# Altium footprint library 学习.PcbLib: 96 footprints (part 6 of 6)
Each footprint in its own frame and in the unit in brackets; x right, y up, seen from the top. Pads: shape width x height; smd on the part's side, far side on the other; paste and mask are expansions set on the pad; w line width, h text height; cw(c..) or ccw(c..) is an arc to the next point about the centre after c.
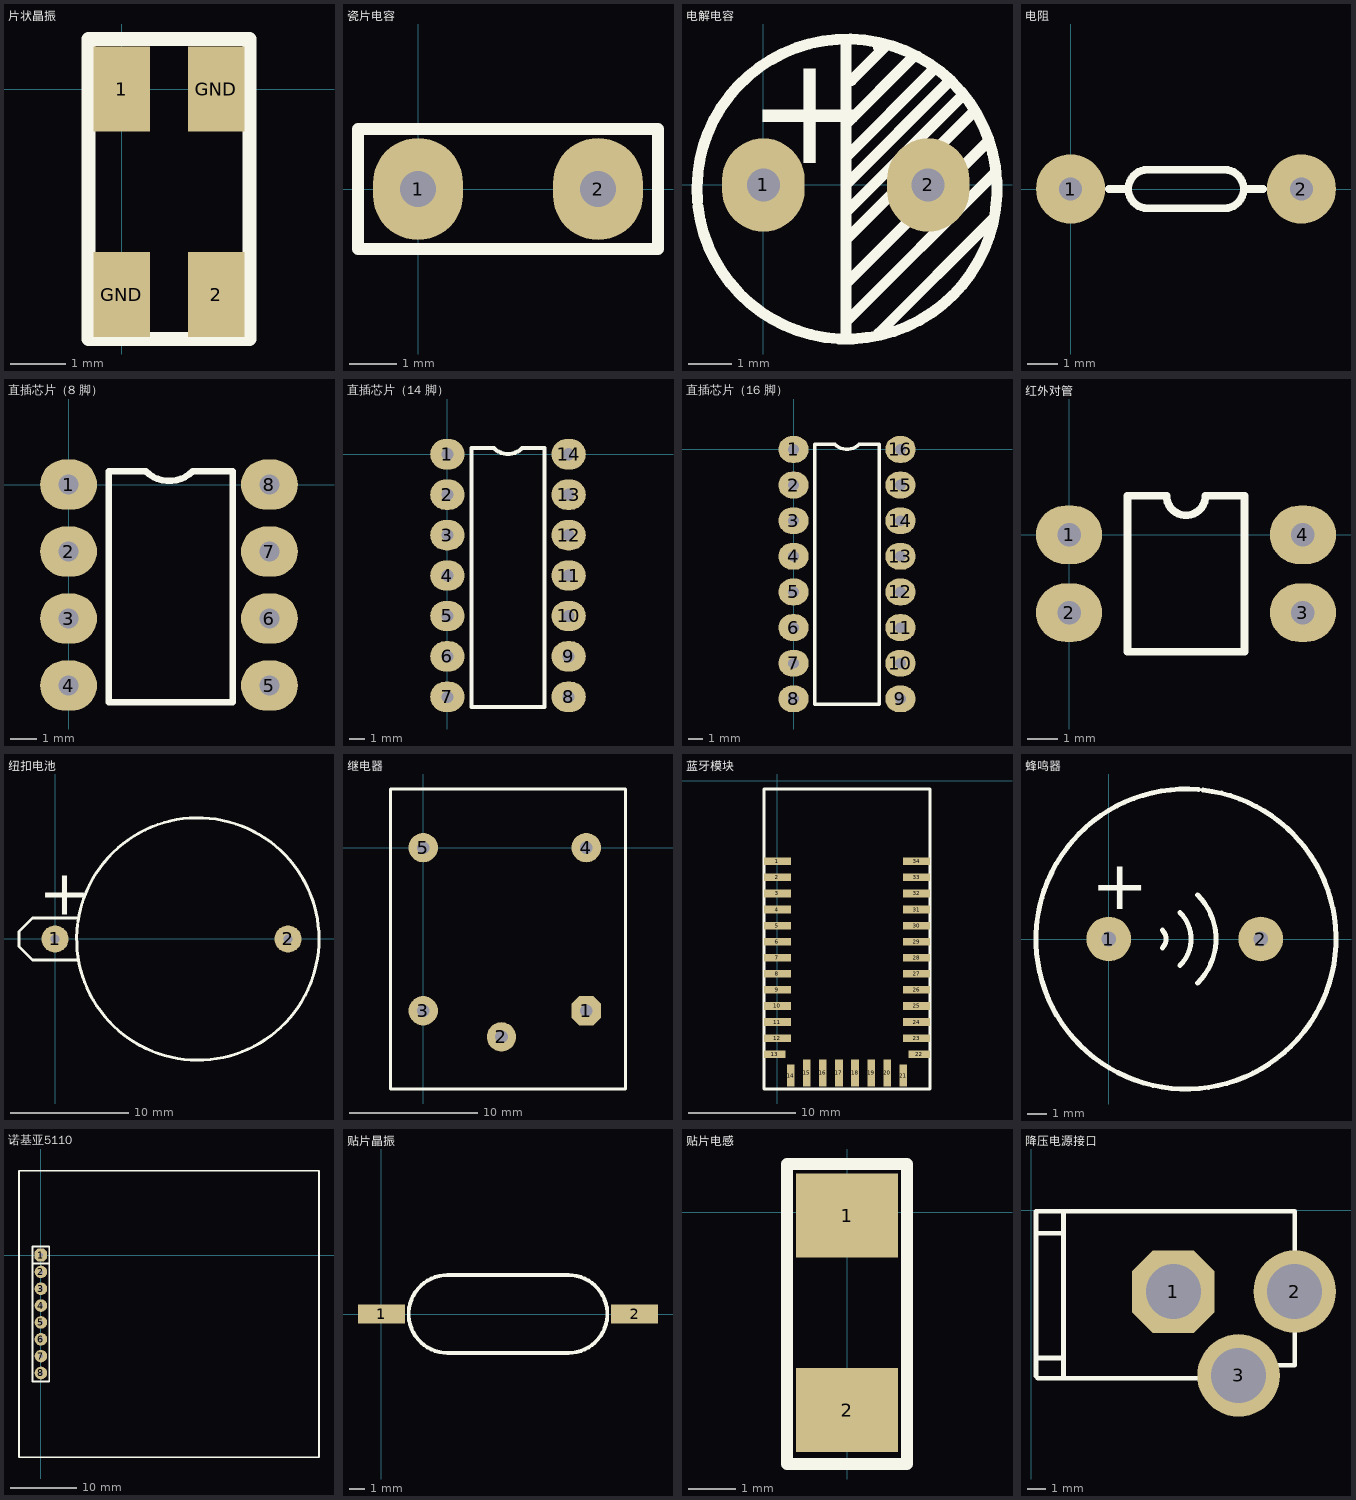
[diagram p5: the footprints below, top view; thin cyan lines are the x and y axes]

## 片状晶振 [mil]
pads (4):
  rect 40x60 smd: 1(0,0) 2(66.93,-145.67) GND(0,-145.67) GND(66.93,0)
Top Overlay:
  lines w10: -23.62,-177.17 -23.62,35.43 90.55,35.43 90.55,-177.17 -23.62,-177.17

## 瓷片电容 [mil]
pads (2):
  oval 75x85 hole 30: 1(0,0) 2(150,0)
Top Overlay:
  lines w10: -50,-50 200,-50 200,50 -50,50 -50,-50

## 电解电容 [mil]
pads (2):
  oval 75x85 hole 30: 1(0,0) 2(150,0)
Top Overlay:
  lines w10: -60,-15 cw(c76.1,-3.66) -59.53,-19.65 ; 75,-140 75,130 ; 75,-125 210,10 ; 75,-100 75,-90 205,40 ; 75,-50 190,65 ; 75,-25 180,80 ; 75,0 170,95 ; 75,25 155,105 ; 75,50 75,55 135,115 ; 75,95 80,95 110,125 105,125 ; 105,-135 210,-30
  text "+" at -15,20 h100

## 电阻 [mil]
pads (2):
  round 90 hole 30 mask+4: 1(0,0) 2(300,0)
Top Overlay:
  lines w10: 50,0 75,0 ; 200,-25 ccw(c200,0) 200,25 100,25 ccw(c100,0) 100,-25 205,-25 ; 225,0 250,0

## 直插芯片（8 脚） [mil]
pads (8):
  oval 85x75 hole 30: 1(0,0) 2(0,-100) 3(0,-200) 4(0,-300) 5(300,-300) 6(300,-200) 7(300,-100) 8(300,0)
Top Overlay:
  lines w10: 60,-325 60,20 115,20 ccw(c150.36,55.36) 185.71,20 245,20 245,-325 60,-325

## 直插芯片（14 脚） [mil]
pads (14):
  oval 85x75 hole 30: 1(0,0) 2(0,-100) 3(0,-200) 4(0,-300) 5(0,-400) 6(0,-500) 7(0,-600) 8(300,-600) 9(300,-500) 10(300,-400) 11(300,-300) 12(300,-200) 13(300,-100) 14(300,0)
Top Overlay:
  lines w10: 60,-625 240,-625 240,15 185,15 cw(c150,50) 115,15 60,15 ; 60,15 60,-620 60,15

## 直插芯片（16 脚） [mil]
pads (16):
  oval 85x75 hole 30: 1(0,0) 2(0,-100) 3(0,-200) 4(0,-300) 5(0,-400) 6(0,-500) 7(0,-600) 8(0,-700) 9(300,-700) 10(300,-600) 11(300,-500) 12(300,-400) 13(300,-300) 14(300,-200) 15(300,-100) 16(300,0)
Top Overlay:
  lines w10: 60,-715 60,15 115,15 ccw(c150,50) 185,15 240,15 240,-715 60,-715

## 红外对管 [mil]
pads (4):
  oval 85x75 / inner oval 85x60 / far side oval 85x60 hole 30: 1(0,0) 2(0,-100) 3(300,-100) 4(300,0)
Top Overlay:
  lines w10: 75,-150 75,50 125,50 ccw(c150,50) 175,50 225,50 225,-150 75,-150

## 纽扣电池 [mil]
pads (2):
  round 90 hole 30: 1(0,0) 2(775,0)
Top Overlay:
  lines w10: 75,-70 -75,-70 -120,-25 -120,25 -75,70 75,70 ; 75,50 ccw(c475,0) 75.94,57.01
  text "+" at -55,80 h150

## 继电器 [mil]
pads (5):
  oct 90x90 hole 39.37: 1(500,-500)
  round 90 hole 39.37: 2(240,-580) 3(0,-500) 4(500,0) 5(0,0)
Top Overlay:
  lines w10: -100,-740 620,-740 620,180 -100,180 -100,-740

## 蓝牙模块 [mm]
pads (34):
  rect 2.54x0.711 smd: 1(0,-7.5) 2(0,-9) 3(0,-10.5) 4(0,-12) 5(0,-13.5) 6(0,-15) 7(0,-16.5) 8(0,-18) 9(0,-19.5) 10(0,-21) 11(0,-22.5) 12(0,-24) 23(13,-24) 24(13,-22.5) 25(13,-21) 26(13,-19.5) 27(13,-18) 28(13,-16.5) 29(13,-15) 30(13,-13.5) 31(13,-12) 32(13,-10.5) 33(13,-9) 34(13,-7.5)
  rect 2.032x0.711 smd: 13(-0.25,-25.5) 22(13.25,-25.5)
  rect 0.711x2.032 smd: 14(1.25,-27.5) 21(11.75,-27.5)
  rect 0.711x2.54 smd: 15(2.75,-27.25) 16(4.25,-27.25) 17(5.75,-27.25) 18(7.25,-27.25) 19(8.75,-27.25) 20(10.25,-27.25)
Top Overlay:
  lines w0.254: -1.25,-28.75 14.25,-28.75 14.25,-0.75 -1.25,-0.75 -1.25,-28.75

## 蜂鸣器 [mil]
pads (2):
  round 90 hole 30: 1(0,0) 2(305,0)
Top Overlay:
  lines w10: 107.68,-17.68 ccw(c90,0) 107.68,17.68 ; 143.03,-53.03 ccw(c90,0) 143.03,53.03 ; 178.39,-88.39 ccw(c90,0) 178.39,88.39 ; 180,300 ccw(c155,0) 188.99,299.11
  text "+" at -35,60 h100

## 诺基亚5110 [mil]
pads (8):
  oct 75x75 hole 25: 1(0,0)
  round 75 hole 25: 2(0,-100) 3(0,-200) 4(0,-300) 5(0,-400) 6(0,-500) 7(0,-600) 8(0,-700)
Top Overlay:
  lines w10: -50,-50 50,-50 ; -130,-1200 -130,500 100,500 1650,500 1650,-1200 -130,-1200 ; -50,-750 -50,50 50,50 50,-750 -50,-750

## 贴片晶振 [mil]
pads (2):
  rect 120x50 smd: 1(0,0) 2(650,0)
Top Overlay:
  lines w10: 170,-100 cw(c170,0) 170,100 480,100 cw(c480,0) 480,-100 170,-100

## 贴片电感 [mil]
pads (2):
  rect 85x70 smd: 1(0,-2.95) 2(0,-165)
Top Overlay:
  lines w10: -50,-210 -50,40 50,40 50,-210 -50,-210

## 降压电源接口 [mm]
pads (3):
  oct 4.5x4.5 hole 3: 1(7.747,-4.445)
  round 4.5 hole 3: 2(14.363,-4.445) 3(11.303,-9.017)
Top Overlay:
  lines w0.254: 0.263,-8.069 1.763,-8.069 ; 0.263,-1.269 1.763,-1.269 ; 1.763,-9.169 1.763,-0.069 ; 3.763,-9.169 12.663,-9.169 13.263,-9.169 13.263,-8.469 14.363,-8.469 14.363,-0.069 13.163,-0.069 4.063,-0.069 0.263,-0.069 0.263,-9.069 0.363,-9.169 4.063,-9.169